# Altium footprint library UP-ROBOT Connectors(2013-02-26).PcbLib: 121 footprints (part 5 of 8)
Each footprint in its own frame and in the unit in brackets; x right, y up, seen from the top. Pads: shape width x height; smd on the part's side, far side on the other; paste and mask are expansions set on the pad; w line width, h text height; cw(c..) or ccw(c..) is an arc to the next point about the centre after c.
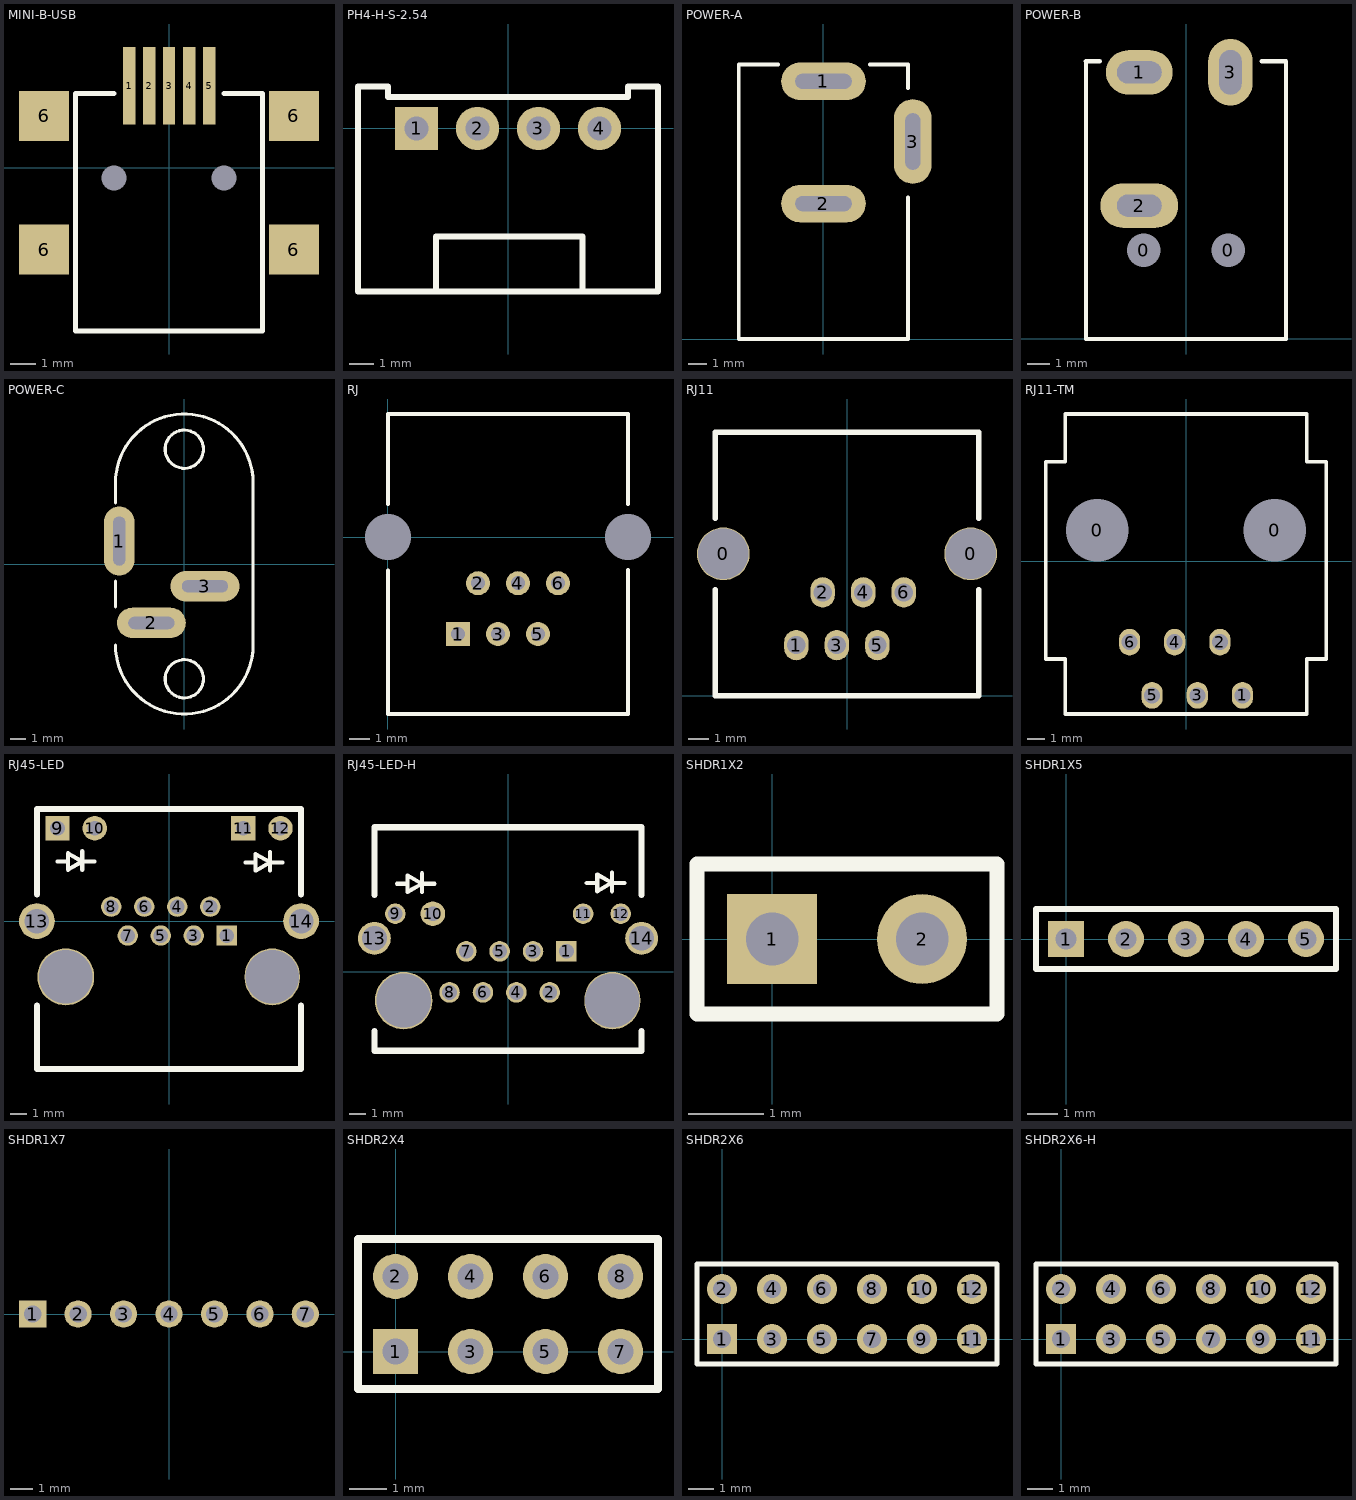
[diagram p4: the footprints below, top view; thin cyan lines are the x and y axes]

## MINI-B-USB [mm]
pads (11):
  rect 0.1x0.1 hole 1: 0(-2.2,-0.405) 0(2.2,-0.405)
  rect 0.5x3.1 smd: 1(-1.6,3.275) 2(-0.8,3.275) 3(0,3.275) 4(0.8,3.275) 5(1.6,3.275)
  rect 2x2 smd: 6(-5,-3.275) 6(-5,2.075) 6(5,-3.275) 6(5,2.075)
Top Overlay:
  lines w0.2: -2.2,2.975 -3.75,2.975 -3.75,-6.525 3.75,-6.525 ; 2.2,2.975 3.75,2.975 3.75,-6.525 ; 3.5,-6.525 3.75,-6.525
3D body: height 3.95, standoff -1, extent -5.32,-6.29 5.38,2.91

## PH4-H-S-2.54 [mm]
pads (4):
  rect 1.8x1.8 hole 1: 1(-3.81,0)
  round 1.8 hole 1: 2(-1.27,0) 3(1.27,0) 4(3.81,0)
Top Overlay:
  lines w0.254: -3,-6.8 -3,-4.5 3.1,-4.5 3.1,-6.8 ; -6.25,-6.8 -3.3,-6.8 6.25,-6.8 6.25,1.75 5,1.75 5,1.3 -5,1.3 -5,1.75 -6.25,1.75 -6.25,-6.8
3D body: height 4.8, standoff -1.91, extent -6.2,-6.9 6.34,0.9

## POWER-A [mm]
pads (3):
  oval 4.5x2 hole 0.8 slot 3 at 0 deg: 1(0,13.7) 2(0,7.2)
  oval 2x4.5 hole 0.8 slot 3 at 90 deg: 3(4.75,10.5)
Top Overlay:
  lines w0.2: -2.411,14.6 -4.5,14.6 -4.5,0 4.5,0 4.5,7.525 ; 2.475,14.6 4.5,14.6 4.5,13.35
3D body: height 11, standoff -4, extent -4.35,-0.3 4.75,13.7

## POWER-B [mm]
pads (5):
  round 1.4 hole 1.5: 0(-1.9,4) 0(1.9,4)
  oval 3x2 hole 1 slot 2 at 0 deg: 1(-2.1,12)
  oval 3.5x2 hole 1 slot 2 at 0 deg: 2(-2.1,6)
  oval 2x3 hole 1 slot 2 at 90 deg: 3(2,12)
Top Overlay:
  lines w0.2: -4.5,12.5 -4.5,0 4.5,0 4.5,8.55 ; 3.4,12.5 4.5,12.5 4.5,8 ; -2.411,12.5 -2.411,12.5
  lines w0.203: -4.5,12.5 -3.875,12.5
3D body: height 3.5, standoff -11.5, extent -4.4,0 4.4,12.5

## POWER-C [mm]
pads (3):
  oval 2x4.5 hole 0.8 slot 3.2 at 90 deg: 1(-4.25,1.5)
  oval 4.5x2 hole 0.8 slot 3 at 0 deg: 2(-2.15,-3.85) 3(1.35,-1.45)
Top Overlay:
  circle w0.203: c0,-7.5 r1.25
  circle w0.203: c0,7.5 r1.25
  lines w0.203: -4.5,-5.3 ccw(c0,-5.3) 4.5,-5.3 4.5,0 4.5,5.3 ccw(c0,5.3) -4.5,5.3 -4.5,4 ; -4.5,-2.8 -4.5,-1.1
3D body: height 11.8, standoff -4.46, extent -4.5,-9.7 4.5,9.8

## RJ [mm]
pads (8):
  round 0 hole 2.3: 0(0,0) 0(12,0)
  rect 1.2x1.2 hole 0.7: 1(3.5,-4.84)
  round 1.2 hole 0.7: 2(4.5,-2.3) 3(5.5,-4.84) 4(6.5,-2.3) 5(7.5,-4.84) 6(8.5,-2.3)
Top Overlay:
  lines w0.2: 0,-1.66 0,-8.84 12,-8.84 12,-1.63 ; 0,1.66 0,6.16 12,6.16 12,1.66
3D body: height 14.61, standoff -3.14, extent -1.15,-9.02 13.25,5.98

## RJ11 [mm]
pads (8):
  round 2.6 hole 2.5: 0(-6.1,7) 0(6.1,7)
  oval 1.2x1.5 hole 0.9: 1(-2.5,2.5) 2(-1.2,5.1) 3(-0.5,2.5) 4(0.8,5.1) 5(1.5,2.5) 6(2.8,5.1)
Top Overlay:
  lines w0.254: -6.5,5.25 -6.5,0 0,0 6.5,0 6.5,5.25 ; -6.5,8.75 -6.5,13 6.5,13 6.5,8.75
3D body: height 14.5, standoff -3, extent -7.3,0 7.3,13

## RJ11-TM [mm]
pads (8):
  round 2.6 hole 3.5: 0(-5,1.75) 0(5,1.75)
  oval 1.2x1.5 hole 0.9: 1(3.18,-7.55) 2(1.91,-4.55) 3(0.64,-7.55) 4(-0.64,-4.55) 5(-1.91,-7.55) 6(-3.18,-4.55)
Top Overlay:
  lines w0.203: -7.9,-5.5 -7.9,5.6 -6.8,5.6 -6.8,8.3 0,8.3 6.8,8.3 6.8,5.6 7.9,5.6 7.9,-5.5 6.8,-5.5 6.8,-8.6 0,-8.6 -6.8,-8.6 -6.8,-5.5 -7.9,-5.5
3D body: height 16.4, standoff -4, extent -7.9,-8.2 7.8,8.3

## RJ45-LED [mm]
pads (16):
  rect 1.25x1.25 hole 0.9: 1(3.556,-0.889)
  round 1.25 hole 0.9: 2(2.54,0.889) 3(1.524,-0.889) 4(0.508,0.889) 5(-0.508,-0.889) 6(-1.524,0.889) 7(-2.54,-0.889) 8(-3.556,0.889)
  rect 1.5x1.5 hole 0.9: 9(-6.858,5.715) 11(4.572,5.715)
  round 1.5 hole 0.9: 10(-4.572,5.715) 12(6.858,5.715)
  round 2.2 hole 1.5: 13(-8.128,0) 14(8.128,0)
  round 3.5 hole 3.3: ""(-6.35,-3.429)
  oval 3.4x3.5 hole 3.3: ""(6.35,-3.429)
Top Overlay:
  lines w0.254: -6.858,3.666 -6.223,3.666 ; -5.334,3.158 -5.334,4.301 ; -4.572,3.666 -5.334,3.666 ; 4.697,3.616 5.332,3.616 ; 6.221,3.108 6.221,4.251 ; 6.983,3.616 6.221,3.616 ; -5.334,3.666 -6.223,3.158 -6.223,4.174 -5.334,3.666 ; 6.221,3.616 5.332,3.108 5.332,4.124 6.221,3.616
  lines w0.381: -8.128,-5.207 -8.128,-9.1 8.128,-9.1 8.128,-5.207 ; -8.128,1.651 -8.128,6.9 8.128,6.9 8.128,1.651
3D body: height 3.48, standoff -14.95, extent -8.38,-9.35 8.33,6.9

## RJ45-LED-H [mm]
pads (16):
  rect 1.25x1.25 hole 0.9: 1(3.556,1.25)
  round 1.25 hole 0.9: 2(2.54,-1.25) 3(1.524,1.25) 4(0.508,-1.25) 5(-0.508,1.25) 6(-1.524,-1.25) 7(-2.54,1.25) 8(-3.556,-1.25) 9(-6.858,3.54) 11(4.572,3.54) 12(6.858,3.54)
  round 1.5 hole 0.9: 10(-4.572,3.54)
  round 2 hole 1.5: 13(-8.128,2.04) 14(8.128,2.04)
  round 3.5 hole 3.3: ""(-6.35,-1.75)
  oval 3.4x3.5 hole 3.3: ""(6.35,-1.75)
Top Overlay:
  lines w0.254: -6.758,5.366 -6.123,5.366 ; -5.234,4.858 -5.234,6.001 ; -4.472,5.366 -5.234,5.366 ; 4.797,5.416 5.432,5.416 ; 6.321,4.908 6.321,6.051 ; 7.083,5.416 6.321,5.416 ; -5.234,5.366 -6.123,4.858 -6.123,5.874 -5.234,5.366 ; 6.321,5.416 5.432,4.908 5.432,5.924 6.321,5.416
  lines w0.381: -8.128,-3.6 -8.128,-4.8 8.128,-4.8 8.128,-3.6 ; -8.128,4.7 -8.128,8.8 8.128,8.8 8.128,4.7
3D body: height 16.75, standoff -2.3, extent -8.373,-4.8 8.373,8.66

## SHDR1X2 [mm]
pads (2):
  rect 1.2x1.2 hole 0.7: 1(0,0)
  round 1.2 hole 0.7: 2(2,0)
Top Overlay:
  lines w0.203: -1,-1 3,-1 3,1 -1,1 -1,-1

## SHDR1X5 [mm]
pads (5):
  rect 1.2x1.2 hole 0.7: 1(0,0)
  round 1.2 hole 0.7: 2(2,0) 3(4,0) 4(6,0) 5(8,0)
Top Overlay:
  lines w0.203: -1,-1 -1,1 9,1 9,-1 -1,-1

## SHDR1X7 [mm]
height 1
pads (7):
  rect 1.2x1.2 hole 0.762: 1(-6,0)
  round 1.2 hole 0.762: 2(-4,0) 3(-2,0) 4(0,0) 5(2,0) 6(4,0) 7(6,0)

## SHDR2X4 [mm]
pads (8):
  rect 1.2x1.2 hole 0.7: 1(0,0)
  round 1.2 hole 0.7: 2(0,2) 3(2,0) 4(2,2) 5(4,0) 6(4,2) 7(6,0) 8(6,2)
Top Overlay:
  lines w0.203: -1,-1 -1,3 7,3 7,-1 -1,-1

## SHDR2X6 [mm]
pads (12):
  rect 1.2x1.2 hole 0.7: 1(0,0)
  round 1.2 hole 0.7: 2(0,2) 3(2,0) 4(2,2) 5(4,0) 6(4,2) 7(6,0) 8(6,2) 9(8,0) 10(8,2) 11(10,0) 12(10,2)
Top Overlay:
  lines w0.203: -1,-1 11,-1 11,3 -1,3 -1,-1

## SHDR2X6-H [mm]
pads (12):
  rect 1.2x1.2 hole 0.7: 1(0,0)
  round 1.2 hole 0.7: 2(0,2) 3(2,0) 4(2,2) 5(4,0) 6(4,2) 7(6,0) 8(6,2) 9(8,0) 10(8,2) 11(10,0) 12(10,2)
Top Overlay:
  lines w0.203: -1,-1 -1,3 11,3 11,-1 -1,-1
3D body: height 4, standoff -3, extent -0.975,-7.4 11.025,2.3